# Altium footprint library wilamp_st_v1p00.PcbLib: 52 footprints (part 4 of 4)
Each footprint in its own frame and in the unit in brackets; x right, y up, seen from the top. Pads: shape width x height; smd on the part's side, far side on the other; paste and mask are expansions set on the pad; w line width, h text height; cw(c..) or ccw(c..) is an arc to the next point about the centre after c.
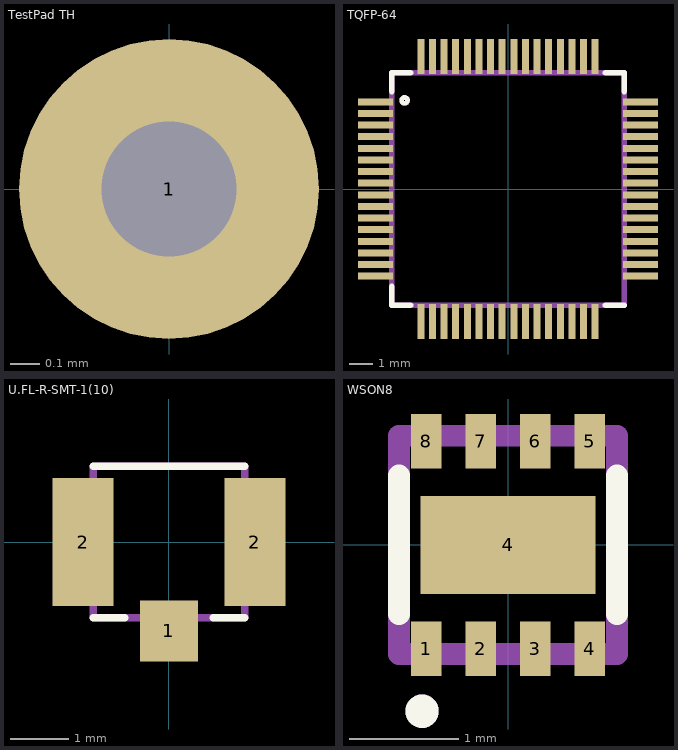
[diagram p3: the footprints below, top view; thin cyan lines are the x and y axes]

## TestPad TH [mil]
pads (1):
  round 40 / inner round 30 / far side round 30 hole 18: 1(0,0)

## TQFP-64 [mm]
pads (64):
  rect 1.5x0.3 smd: 1(-5.7,3.75) 2(-5.7,3.25) 3(-5.7,2.75) 4(-5.7,2.25) 5(-5.7,1.75) 6(-5.7,1.25) 7(-5.7,0.75) 8(-5.7,0.25) 9(-5.7,-0.25) 10(-5.7,-0.75) 11(-5.7,-1.25) 12(-5.7,-1.75) 13(-5.7,-2.25) 14(-5.7,-2.75) 15(-5.7,-3.25) 16(-5.7,-3.75) 33(5.7,-3.75) 34(5.7,-3.25) 35(5.7,-2.75) 36(5.7,-2.25) 37(5.7,-1.75) 38(5.7,-1.25) 39(5.7,-0.75) 40(5.7,-0.25) 41(5.7,0.25) 42(5.7,0.75) 43(5.7,1.25) 44(5.7,1.75) 45(5.7,2.25) 46(5.7,2.75) 47(5.7,3.25) 48(5.7,3.75)
  rect 0.3x1.5 smd: 17(-3.75,-5.7) 18(-3.25,-5.7) 19(-2.75,-5.7) 20(-2.25,-5.7) 21(-1.75,-5.7) 22(-1.25,-5.7) 23(-0.75,-5.7) 24(-0.25,-5.7) 25(0.25,-5.7) 26(0.75,-5.7) 27(1.25,-5.7) 28(1.75,-5.7) 29(2.25,-5.7) 30(2.75,-5.7) 31(3.25,-5.7) 32(3.75,-5.7) 49(3.75,5.7) 50(3.25,5.7) 51(2.75,5.7) 52(2.25,5.7) 53(1.75,5.7) 54(1.25,5.7) 55(0.75,5.7) 56(0.25,5.7) 57(-0.25,5.7) 58(-0.75,5.7) 59(-1.25,5.7) 60(-1.75,5.7) 61(-2.25,5.7) 62(-2.75,5.7) 63(-3.25,5.7) 64(-3.75,5.7)
Top Overlay:
  circle w0.2: c-4.445,3.81 r0.127
  lines w0.254: -5,-4.191 -5,-5 -4.191,-5 ; -5,4.191 -5,5 -4.191,5 ; 4.191,-5 5,-5 ; 4.191,5 5,5 5,4.191
Mechanical 16:
  circle w0.2: c-4.445,3.81 r0.127
  lines w0.254: -5,-5 -5,5 5,5 5,-5 -5,-5
Mechanical 29:
  text ".Designator" at 2.642,1.782 h3
3D body "User Library-TQFP64-2.STEP": height 1.23, standoff 0.03, extent -6.1,-6.1 6.1,6.1

## U.FL-R-SMT-1(10) [mm]
pads (3):
  rect 1x1.05 smd: 1(0,-1.525)
  rect 1.05x2.2 smd: 2(-1.475,0) 2(1.475,0)
Top Overlay:
  lines w0.127: -1.3,-1.3 -0.762,-1.3 ; -1.3,1.3 1.3,1.3 ; 0.762,-1.3 1.3,-1.3
Mechanical 16:
  lines w0.127: -1.3,-1.3 -1.3,1.3 1.3,1.3 1.3,-1.3 -1.3,-1.3
Mechanical 29:
  text ".Designator" at 0.652,0.365 h1
3D body "U.FL-R-SMT-1.stp": height 1.25, standoff 0, extent -1.5,-1.525 1.5,1.575

## WSON8 [mm]
pads (9):
  rect 0.28x0.5 smd paste+0 mask+0.07: 1(-0.75,-0.95) 2(-0.25,-0.95) 3(0.25,-0.95) 4(0.75,-0.95) 5(0.75,0.95) 6(0.25,0.95) 7(-0.25,0.95) 8(-0.75,0.95)
  rect 1.6x0.9 smd paste+0 mask+0.07: 4(0,0)
Top Overlay:
  circle w0.254: c-0.787,-1.524 r0.025
  lines w0.2: -1,-0.635 -1,0.635 ; 1,-0.635 1,0.635
Mechanical 16:
  circle w0.254: c-0.787,-1.524 r0.025
  lines w0.2: -1,-1 -1,1 1,1 1,-1 -1,-1
Mechanical 29:
  text ".Designator" at 0.731,0.249 h0.38
3D body: height 0.8, standoff 0, extent -1,-1 1,1